# Altium footprint library IDETEC.PcbLib: 275 footprints (part 8 of 18)
Each footprint in its own frame and in the unit in brackets; x right, y up, seen from the top. Pads: shape width x height; smd on the part's side, far side on the other; paste and mask are expansions set on the pad; w line width, h text height; cw(c..) or ccw(c..) is an arc to the next point about the centre after c.
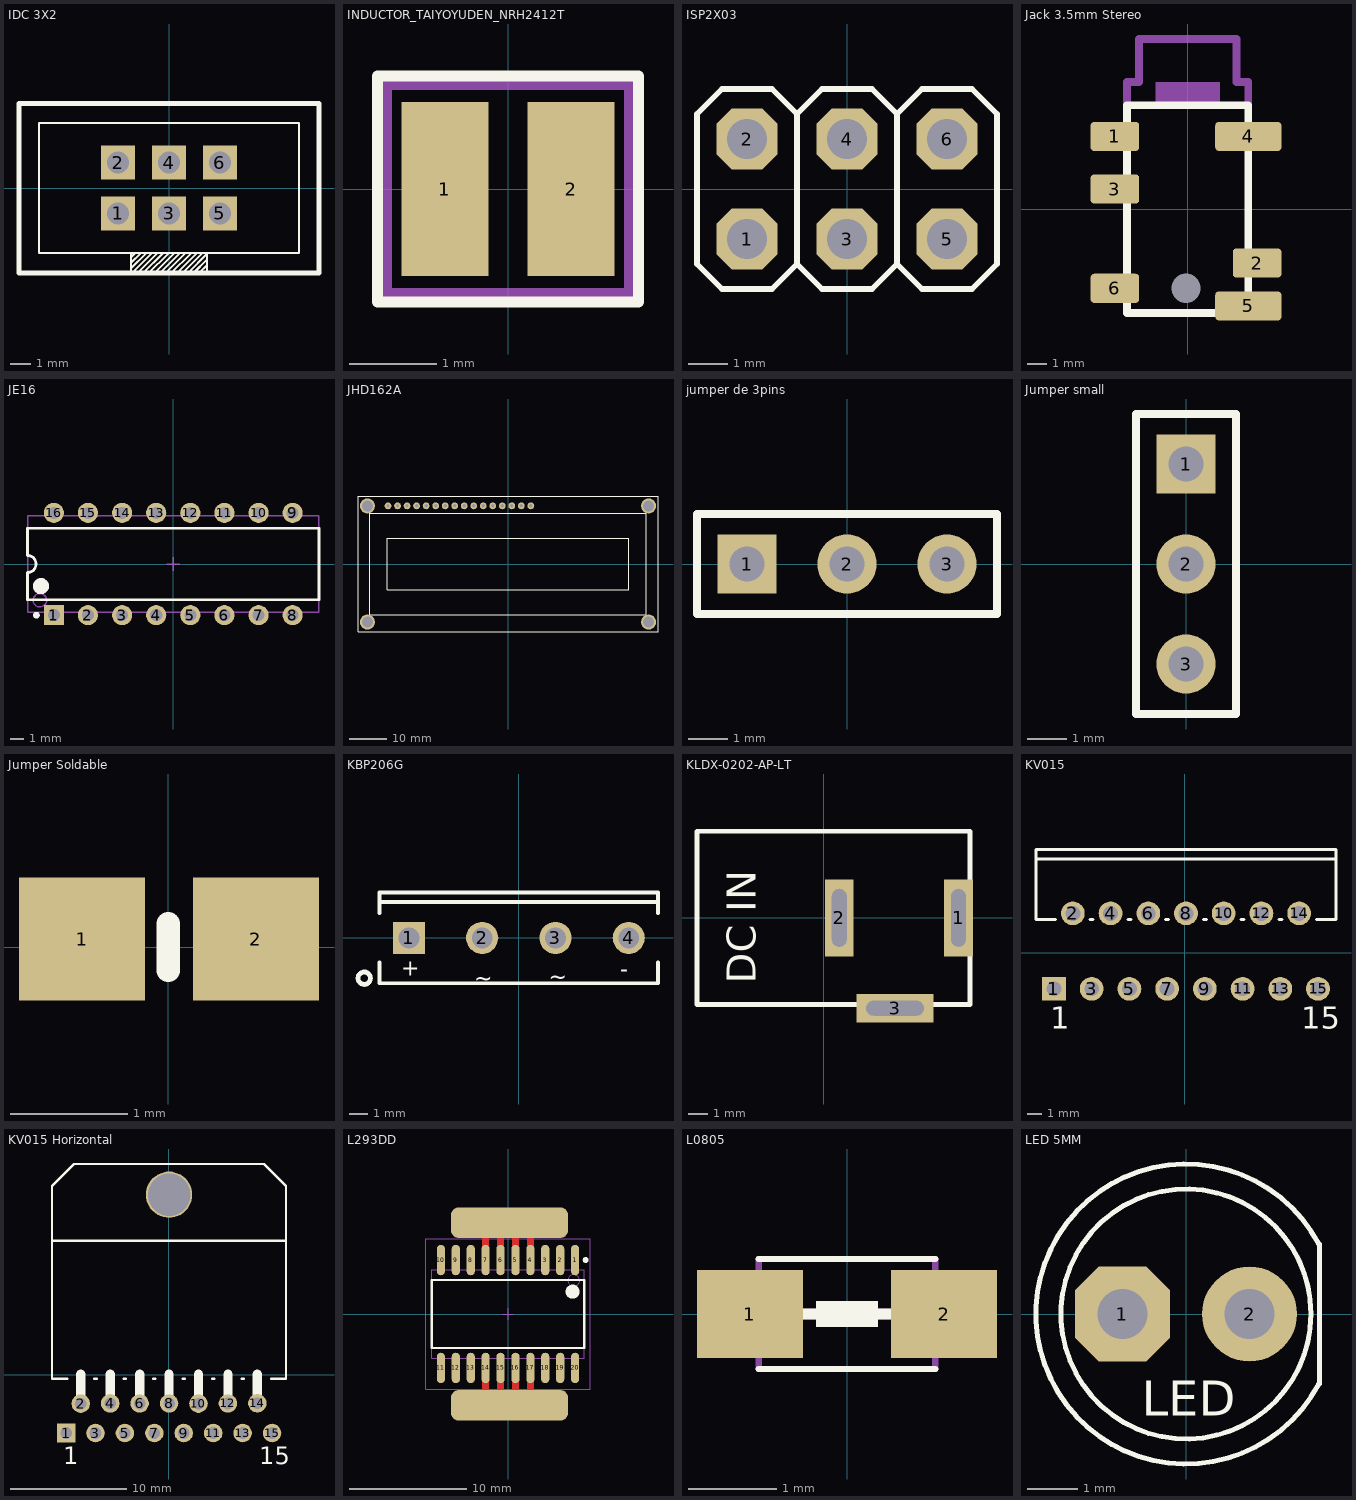
[diagram p7: the footprints below, top view; thin cyan lines are the x and y axes]

## IDC 3X2 [mm] "CONECTOR IDC DE 3X2 2.54mm Header"
height 9
pads (6):
  rect 1.7x1.7 hole 1.1: 1(-2.54,-1.27) 2(-2.54,1.27) 3(0,-1.27) 4(0,1.27) 5(2.54,-1.27) 6(2.54,1.27)
Top Overlay:
  lines w0.1: -1.9,-4.01 -1.14,-3.25 ; -1.9,-3.73 -1.421,-3.25 ; -1.9,-3.45 -1.7,-3.25 ; -1.9,-3.25 -1.9,-4.25 -1.862,-4.25 -0.862,-3.25 ; -1.604,-4.272 -0.582,-3.25 -0.572,-3.25 ; -1.337,-4.265 -1.315,-4.265 -0.299,-3.25 ; -1.053,-4.285 -0.019,-3.25 ; -0.761,-4.273 0.262,-3.25 ; -0.463,-4.255 0.541,-3.251 ; -0.205,-4.279 0.823,-3.251 ; 0.09,-4.266 1.106,-3.25 ; 0.304,-4.331 1.385,-3.251 ; 0.612,-4.304 1.666,-3.25 ; 0.955,-4.236 1.9,-3.29 1.9,-3.25 1.9,-4.25 ; 1.251,-4.22 1.898,-3.573 ; 1.452,-4.264 1.488,-4.264 1.899,-3.852 ; -6.5,-3.25 6.5,-3.25 6.5,3.25 -6.5,3.25 -6.5,-3.25
  lines w0.25: -7.5,-4.25 -7.5,4.24 7.5,4.24 7.5,-4.25 -7.5,-4.25
3D body "User Library-Header2x3-shrouded-vertical.STEP": height 9.12, standoff -3.08, extent -7.62,-4.5 7.62,4.95

## INDUCTOR_TAIYOYUDEN_NRH2412T [mm] "INDUCTOR_TAIYOYUDEN_NRH2412T"
pads (2):
  rect 1x2 smd: 1(-0.725,0) 2(0.725,0)
Top Overlay:
  lines w0.127: -1.5,-1.3 1.5,-1.3 1.5,1.3 -1.5,1.3 -1.5,-1.3
Mechanical 16:
  lines w0.127: -1.4,-1.2 1.4,-1.2 1.4,1.2 -1.4,1.2 -1.4,-1.2

## ISP2X03 [mil] "2X03"
pads (6):
  oct 61.02x61.02 hole 40: 1(-100,-50) 2(-100,50) 3(0,-50) 4(0,50) 5(100,-50) 6(100,50)
Top Overlay:
  lines w6: -50,-75 -50,75 ; -50,-75 -25,-100 25,-100 50,-75 ; -50,-75 -75,-100 -125,-100 -150,-75 -150,75 -125,100 -75,100 -50,75 ; -50,75 -25,100 25,100 50,75 ; 50,-75 75,-100 125,-100 150,-75 150,75 125,100 75,100 50,75 ; 50,-75 50,75
Mechanical 16:
  rectangle: 90,-60 110,-40
  rectangle: 90,40 110,60
  rectangle: -10,-60 10,-40
  rectangle: -10,40 10,60
  rectangle: -110,40 -90,60
  rectangle: -110,-60 -90,-40
3D body "User Library-2x3 TH Pitch 2_54mm.STEP": height 362.2, standoff -137.8, extent -151.26,-99.33 148.74,100.67

## Jack 3.5mm Stereo [mm] "PJ-342"
height 5
pads (7):
  rrect25% 2.5x1.5 smd: 1(-3.738,3.735) 2(3.562,-2.765) 3(-3.738,1.035) 6(-3.738,-4.065)
  rrect25% 3.4x1.5 smd: 4(3.112,3.735) 5(3.112,-4.965)
  round 0 hole 1.5 unplated: ""(-0.087,-4.065)
Top Overlay:
  lines w0.4: -3.113,-5.335 3.112,-5.335 3.112,5.335 -3.113,5.335 -3.113,-5.335
Mechanical 1:
  rectangle: -1.665,5.335 1.665,6.535
  lines w0.4: -3.113,5.335 -3.113,6.535 -2.5,6.535 -2.5,8.735 2.5,8.735 2.5,6.535 3.112,6.535 3.112,5.335
3D body "SJ-43504-SMT.stp": height 4.5, standoff -0.5, extent -4.639,-5.491 4.461,8.509

## JE16 [mm] "DIP, 16-Leads, Row Spacing 7.62mm, Pitch 2.54mm, Body 20.37x6.73mm"
height 5.08
pads (16):
  rect 1.5x1.5 hole 0.9: 1(-8.89,-3.81)
  round 1.5 hole 0.9: 2(-6.35,-3.81) 3(-3.81,-3.81) 4(-1.27,-3.81) 5(1.27,-3.81) 6(3.81,-3.81) 7(6.35,-3.81) 8(8.89,-3.81) 9(8.89,3.81) 10(6.35,3.81) 11(3.81,3.81) 12(1.27,3.81) 13(-1.27,3.81) 14(-3.81,3.81) 15(-6.35,3.81) 16(-8.89,3.81)
Top Overlay:
  circle w0.6: c-9.85,-1.65 r0.3
  circle w0.25: c-10.19,-3.81 r0.125
  lines w0.2: -10.85,-2.65 -10.85,-0.635 ccw(c-10.85,0) -10.85,0.635 -10.85,2.65 10.85,2.65 10.85,-2.65 -10.85,-2.65
Mechanical 13:
  circle w0.1: c-9.925,-2.7 r0.5
  lines w0.1: -10.825,-3.6 -10.825,3.6 10.825,3.6 10.825,-3.6 -10.825,-3.6
Mechanical 15:
  lines w0.1: -0.5,0 0.5,0 ; 0,-0.5 0,0.5
3D body "SW3DPS-DIP 16 IC-DEFAULT.STEP": height 5.1, standoff -3.3, extent -10,-3.935 10,3.935

## JHD162A [mm] "Display 16x2"
pads (20):
  round 1.8 hole 0.9: 1(-32,15.5) 2(-29.46,15.5) 3(-26.92,15.5) 4(-24.38,15.5) 5(-21.84,15.5) 6(-19.3,15.5) 7(-16.76,15.5) 8(-14.22,15.5) 9(-11.68,15.5) 10(-9.14,15.5) 11(-6.6,15.5) 12(-4.06,15.5) 13(-1.52,15.5) 14(1.02,15.5) 15(3.56,15.5) 16(6.1,15.5)
  round 4 hole 3: ""(-37.5,-15.5) ""(-37.5,15.5) ""(37.5,-15.5) ""(37.5,15.5)
Top Overlay:
  lines w0.254: -40,-18 40,-18 40,18 -40,18 -40,-18 ; -36.9,-13.55 -36.9,13.55 36.9,13.55 36.9,-13.55 -36.9,-13.55 ; -32.25,-6.9 32.25,-6.9 32.25,6.9 -32.25,6.9 -32.25,-6.9
3D body "User Library-LCD 16x2 WC1602A0-SFYLNC06.STEP": height 16.4, standoff 3.5, extent -40,-17.925 40.25,18.075
3D body "16 x Samtec-Header 2_54mm Pitch.STEP": height 8.38, standoff -2.54, extent -33.27,14.23 7.37,16.77

## jumper de 3pins [mm] "jumper de 3pins"
height 2
pads (3):
  rect 1.5x1.5 hole 0.9: 1(-2.54,0)
  round 1.5 hole 0.9: 2(0,0) 3(2.54,0)
Top Overlay:
  lines w0.2: -3.81,-1.27 -3.81,1.27 3.81,1.27 3.81,-1.27 -3.81,-1.27
3D body "User Library-SHORTING JUMPER.STEP": height 8.45, standoff 2.55, extent -1.49,-1.25 3.59,1.29
3D body "User Library-Header_Male_3Pin.STEP": height 8.54, standoff -3, extent -3.81,-1.245 3.81,1.245

## Jumper small [mm] "jumper pequeño azul"
height 2
pads (3):
  rect 1.5x1.5 hole 0.9: 1(0,2.54)
  round 1.5 hole 0.9: 2(0,0) 3(0,-2.54)
Top Overlay:
  lines w0.2: -1.27,-3.81 -1.27,3.81 1.27,3.81 1.27,-3.81 -1.27,-3.81
3D body "User Library-Header_Male_RA_Low_3Pin.STEP": height 2.51, standoff -3, extent -9.81,-3.81 0.32,3.81
3D body "User Library-SHORTING JUMPER.STEP": height 2.52, standoff -0.02, extent -9.717,-1.257 -3.817,3.823

## Jumper Soldable [mm]
pads (2):
  rect 1.08x1.05 smd: 1(-0.74,0.07) 2(0.75,0.07)
Top Overlay:
  lines w0.2: 0,-0.2 0,0.2

## KBP206G [mm] "DIODE BRIDGE 2A 600V 1PH KBP"
height 12.7
pads (4):
  rect 1.7x1.7 hole 1.1: 1(-5.805,0)
  round 1.7 hole 1.1: 2(-1.935,0) 3(1.935,0) 4(5.805,0)
Top Overlay:
  circle w0.254: c-8.166,-2.128 r0.326
  lines w0.2: -7.35,-1.3 -7.35,-2.4 7.35,-2.4 7.35,-1.3 ; -7.35,1.3 -7.35,2.4 7.35,2.4 7.35,1.3 ; -7.35,1.9 7.35,1.9
  text "~" at 1.589,-2.447 h0.85
  text "~" at -2.355,-2.518 h0.85
  text "-" at 5.359,-2.062 h0.85
  text "+" at -6.201,-2.005 h0.85
3D body "User Library-KBP.STEP": height 12.19, standoff -3.5, extent -7.365,-2.415 7.365,2.41

## KLDX-0202-AP-LT [mm] "KLDX-0202-AP-LT"
pads (3):
  rect 1.5x4 hole 0.762 slot 3 at 90 deg: 1(7,0) 2(0.8,0)
  rect 4x1.5 hole 0.762 slot 3 at 0 deg: 3(3.7,-4.7)
Top Overlay:
  lines w0.254: -6.6,-4.5 7.6,-4.5 7.6,4.5 -6.6,4.5 -6.6,-4.5
  text "DC IN" at -3.556,-3.429 h1.52
3D body "KYCON KLDX-0202-A.STEP": height 10.8, standoff -4.1, extent -6.892,-4.85 7.592,4.55

## KV015 [mm] "Driver de 2amp hasta 42V dc"
height 24
pads (15):
  rect 1.6x1.6 hole 1: 1(-8.804,-2.411)
  round 1.6 hole 1: 2(-7.534,2.669) 3(-6.264,-2.411) 4(-4.994,2.669) 5(-3.724,-2.411) 6(-2.454,2.669) 7(-1.184,-2.411) 8(0.086,2.669) 9(1.356,-2.411) 10(2.626,2.669) 11(3.896,-2.411) 12(5.166,2.669) 13(6.436,-2.411) 14(7.706,2.669) 15(8.976,-2.411)
Top Overlay:
  lines w0.2: -10.014,6.319 10.186,6.319 ; -8.714,2.269 -10.014,2.269 -10.014,6.969 10.186,6.969 10.186,2.269 8.886,2.269 ; -6.364,2.269 -6.164,2.269 ; -3.824,2.269 -3.624,2.269 ; -1.284,2.269 -1.084,2.269 ; 1.256,2.269 1.456,2.269 ; 3.796,2.269 3.996,2.269 ; 6.336,2.269 6.536,2.269
  text "1" at -9.054,-5.086 h1.5
  text "15" at 7.851,-5.086 h1.5
3D body "User Library-Multiwatt15V.STEP": height 21.1, standoff -1.2, extent -9.725,-2.765 9.875,7.125

## KV015 Horizontal [mm] "driver de 2Amp 42V horizontal"
pads (16):
  rect 1.6x1.6 hole 1: 1(-8.88,-5.05)
  round 1.6 hole 1: 2(-7.61,-2.51) 3(-6.34,-5.05) 4(-5.07,-2.49) 5(-3.8,-5.05) 6(-2.53,-2.5) 7(-1.26,-5.05) 8(0.01,-2.5) 9(1.28,-5.05) 10(2.55,-2.51) 11(3.82,-5.05) 12(5.09,-2.5) 13(6.36,-5.05) 14(7.63,-2.48) 15(8.9,-5.05)
  round 4 hole 3.66: ""(0.01,15.52)
Top Overlay:
  lines w0.2: -10.1,11.54 10.11,11.54 ; -8.79,-0.37 -10.09,-0.37 -10.09,16.27 -8.19,18.17 8.21,18.17 10.11,16.27 10.11,-0.37 ; -6.44,-0.37 -6.24,-0.37 ; -3.9,-0.37 -3.7,-0.37 ; -1.36,-0.37 -1.16,-0.37 ; 1.18,-0.37 1.38,-0.37 ; 3.72,-0.37 3.92,-0.37 ; 6.26,-0.37 6.46,-0.37 ; 8.81,-0.37 10.11,-0.37 ; 10.101,12.895 10.11,12.886 10.11,-0.37
  lines w0.8: -7.61,-2.51 -7.61,0.03 ; -5.07,-2.49 -5.07,0.03 ; -2.53,-2.5 -2.53,0.03 ; 0.01,-2.5 0.01,0.03 ; 2.55,-2.51 2.55,0.03 ; 5.09,-2.5 5.09,0.03 ; 7.63,-2.48 7.63,0.03
  text "1" at -9.13,-7.725 h1.5
  text "15" at 7.775,-7.725 h1.5
3D body "User Library-Multiwatt15H.STEP": height 5, standoff -1.5, extent -9.777,-5.332 9.823,18.268

## L293DD [mm] "L293DD"
height 2
pads (22):
  oval 0.7x2.6 smd: 1(5.715,4.6) 2(4.445,4.6) 3(3.175,4.6) 4(1.905,4.6) 5(0.635,4.6) 6(-0.635,4.6) 7(-1.905,4.6) 8(-3.175,4.6) 9(-4.445,4.6) 10(-5.715,4.6) 11(-5.715,-4.6) 12(-4.445,-4.6) 13(-3.175,-4.6) 14(-1.905,-4.6) 15(-0.635,-4.6) 16(0.635,-4.6) 17(1.905,-4.6) 18(3.175,-4.6) 19(4.445,-4.6) 20(5.715,-4.6)
  rrect50% 10x2.6 smd: ""(0.13,-7.78) ""(0.13,7.78)
Top Layer:
  lines w0.254: -1.905,-7.62 -0.635,-7.62 0.635,-7.62 1.905,-7.62 ; -1.905,7.62 -0.635,7.62 0.635,7.62 1.905,7.62
  lines w0.6: -1.905,-7.62 -1.905,-4.6 ; -1.905,4.6 -1.905,7.62 ; -0.635,-7.62 -0.635,-4.6 ; -0.635,4.6 -0.635,7.62 ; 0.635,-7.62 0.635,-4.6 ; 0.635,4.6 0.635,7.62 ; 1.905,-7.62 1.905,-4.6 ; 1.905,4.6 1.905,7.62
Top Overlay:
  circle w0.25: c6.615,4.6 r0.125
  circle w0.6: c5.5,1.9 r0.3
  lines w0.2: -6.5,-2.9 6.5,-2.9 6.5,2.9 -6.5,2.9 -6.5,-2.9
Mechanical 13:
  circle w0.1: c5.6,2.85 r0.5
  lines w0.1: -6.5,-3.75 6.5,-3.75 6.5,3.75 -6.5,3.75 -6.5,-3.75
Mechanical 15:
  lines w0.1: -0.5,0 0.5,0 ; 0,-0.5 0,0.5 ; -7,-6.4 7,-6.4 7,6.4 -7,6.4 -7,-6.4
3D body "User Library-SOIC20_JEDEC_MS-013AC.STEP": height 2.66, standoff 0, extent -6.5,-5.315 6.5,5.315

## L0805 [mm] "Inducto package 0805"
pads (2):
  rect 1.2x1 smd: 1(-1.1,0) 2(1.1,0)
Top Overlay:
  rectangle: -0.35,-0.15 0.35,0.15
  lines w0.07: -1,-0.625 1,-0.625 ; -1,0.625 1,0.625
  lines w0.127: -1.3,0 1.2,0
Mechanical 16:
  lines w0.07: -1,-0.625 -1,0.625 ; 1,-0.625 1,0.625
  lines w0.127: -1.1,0 1.1,0
3D body "User Library-ind_0805.STEP": height 0.95, standoff 0, extent -1,-0.6 1,0.6

## LED 5MM [mm] "LED 5mm"
pads (2):
  oct 1.9x1.9 hole 1: 1(-1.27,0)
  round 1.9 hole 1: 2(1.27,0)
Top Overlay:
  circle w0.1: c0,0 r2.5
  lines w0.1: 2.651,-1.404 cw(c0,0) 2.651,1.404 ; 2.667,-1.397 2.667,1.397
  text "LED" at -0.889,-2.032 h0.7
3D body "SW3dPS-LEDd5R.STEP": height 9.31, standoff -5.49, extent -2.98,-3.01 2.44,3.01